# Altium footprint library VC_PCBLib.PcbLib: 63 footprints (part 1 of 4)
Each footprint in its own frame and in the unit in brackets; x right, y up, seen from the top. Pads: shape width x height; smd on the part's side, far side on the other; paste and mask are expansions set on the pad; w line width, h text height; cw(c..) or ccw(c..) is an arc to the next point about the centre after c.
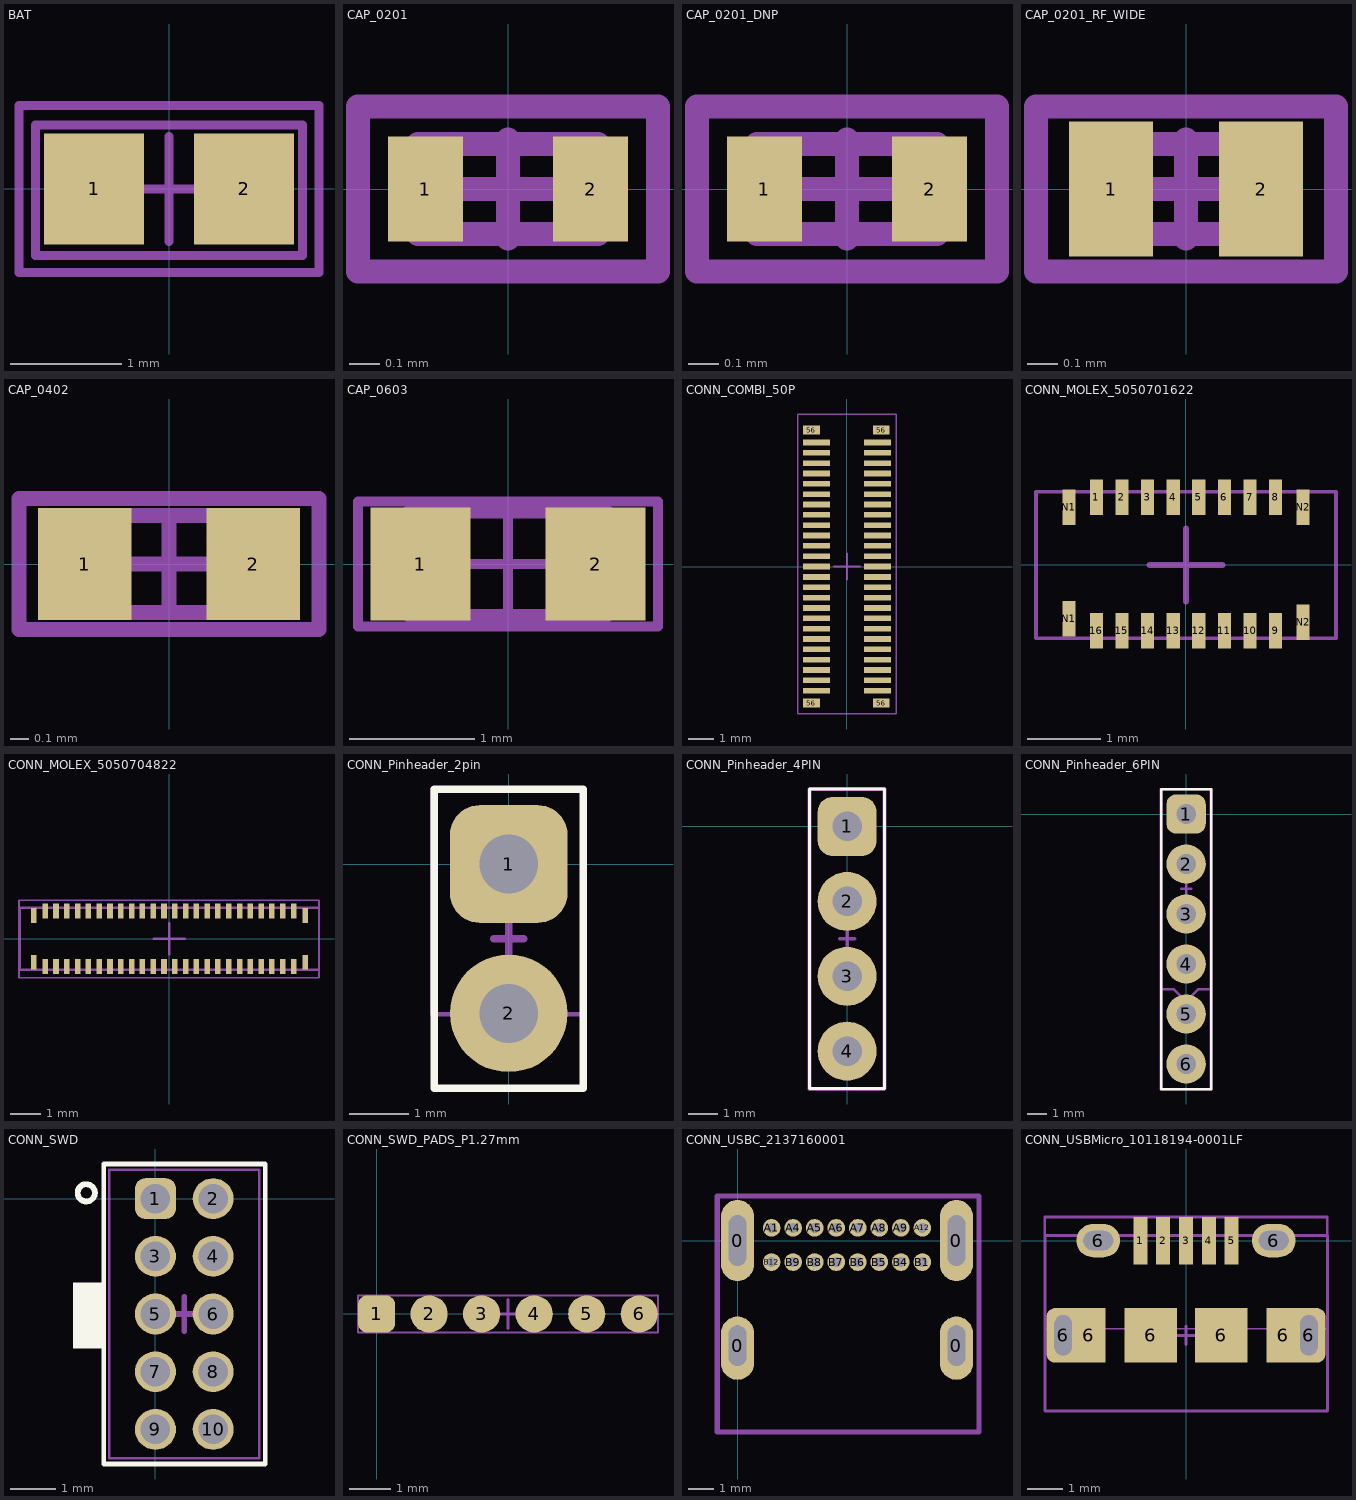
[diagram p0: the footprints below, top view; thin cyan lines are the x and y axes]

## BAT [mm] "Chip Capacitor, 2-Leads, Body 1.60x0.80mm, IPC Medium Density"
height 0.89
pads (2):
  rect 0.9x1 smd: 1(-0.675,0) 2(0.675,0)
Top Assembly:
  lines w0.08: -1.35,-0.75 1.35,-0.75 1.35,0.75 -1.35,0.75 -1.35,-0.75
Top Courtyard:
  lines w0.08: -1.2,-0.6 -1.2,0.575 1.2,0.575 1.2,-0.6 -1.2,-0.6
Top Component Center:
  lines w0.08: -0.475,0 0.475,0 ; 0,-0.475 0,0.475

## CAP_0201 [mm]
height 0.33
pads (2):
  rect 0.25x0.35 smd: 1(-0.275,0) 2(0.275,0)
Top Assembly:
  lines w0.08: -0.5,-0.275 -0.5,0.275 0.5,0.275 0.5,-0.275 -0.5,-0.275
Top Component Outline:
  lines w0.08: -0.3,-0.15 -0.3,0.15 0.3,0.15 0.3,-0.15 -0.3,-0.15
Top Courtyard:
  lines w0.08: -0.5,-0.275 0.5,-0.275 0.5,0.275 -0.5,0.275 -0.5,-0.275
Top Component Center:
  lines w0.08: -0.165,0 0.165,0 ; -0.05,0 0.05,0 ; 0,-0.165 0,0.165 ; 0,-0.05 0,0.05
3D body "CAP 0201.STEP": height 0.3, standoff 0, extent -0.3,-0.15 0.3,0.15

## CAP_0201_DNP [mm]
height 0.33
pads (2):
  rect 0.25x0.35 smd: 1(-0.275,0) 2(0.275,0)
Top Assembly:
  lines w0.08: -0.5,-0.275 0.5,-0.275 0.5,0.275 -0.5,0.275 -0.5,-0.275
Top Component Outline:
  lines w0.08: -0.3,-0.15 0.3,-0.15 0.3,0.15 -0.3,0.15 -0.3,-0.15
Top Courtyard:
  lines w0.08: -0.5,-0.275 -0.5,0.275 0.5,0.275 0.5,-0.275 -0.5,-0.275
Top Component Center:
  lines w0.08: -0.165,0 0.165,0 ; -0.05,0 0.05,0 ; 0,-0.165 0,0.165 ; 0,-0.05 0,0.05
3D body "CAP 0201.STEP": height 0.3, standoff 0, extent -0.3,-0.15 0.3,0.15

## CAP_0201_RF_WIDE [mm]
height 0.33
pads (2):
  rect 0.28x0.45 smd: 1(-0.25,0) 2(0.25,0)
Top Assembly:
  lines w0.08: -0.5,-0.275 0.5,-0.275 0.5,0.275 -0.5,0.275 -0.5,-0.275
Top Component Outline:
  lines w0.08: -0.3,-0.15 0.3,-0.15 0.3,0.15 -0.3,0.15 -0.3,-0.15
Top Courtyard:
  lines w0.08: -0.5,-0.275 -0.5,0.275 0.5,0.275 0.5,-0.275 -0.5,-0.275
Top Component Center:
  lines w0.08: -0.165,0 0.165,0 ; -0.05,0 0.05,0 ; 0,-0.165 0,0.165 ; 0,-0.05 0,0.05
3D body "CAP 0201.STEP": height 0.3, standoff 0, extent -0.3,-0.15 0.3,0.15

## CAP_0402 [mm] "Chip Capacitor, 2-Leads, Body 1.02x0.51mm, IPC Medium Density"
height 0.52
pads (2):
  rect 0.5x0.6 smd: 1(-0.45,0) 2(0.45,0)
Top Assembly:
  lines w0.08: -0.8,-0.35 -0.8,0.35 0.8,0.35 0.8,-0.35 -0.8,-0.35
Top Component Outline:
  lines w0.08: -0.5,-0.26 0.5,-0.26 0.5,0.26 -0.5,0.26 -0.5,-0.26
Top Courtyard:
  lines w0.08: -0.8,-0.35 0.8,-0.35 0.8,0.35 -0.8,0.35 -0.8,-0.35
Top Component Center:
  lines w0.08: -0.26,0 0.26,0 ; 0,-0.26 0,0.26
3D body "0402 cap.STEP": height 0.52, standoff 0, extent -0.5,-0.262 0.5,0.262

## CAP_0603 [mm] "Chip Capacitor, 2-Leads, Body 1.60x0.80mm, IPC Medium Density"
height 0.89
pads (2):
  rect 0.8x0.9 smd: 1(-0.7,0) 2(0.7,0)
Top Assembly:
  lines w0.08: -1.2,-0.5 -1.2,0.5 1.2,0.5 1.2,-0.5 -1.2,-0.5
Top Component Outline:
  lines w0.1: -0.8,-0.41 -0.8,0.415 0.8,0.415 0.8,-0.41 -0.8,-0.41
Top Component Center:
  lines w0.08: -0.475,0 0.475,0 ; 0,-0.475 0,0.475
3D body "0603 cap.STEP": height 0.82, standoff 0, extent -0.8,-0.424 0.8,0.4

## CONN_COMBI_50P [mm] "50Pin 0.4mm pitch connector footprint that accepts (male) connectors intended for different stacking heights:  Hirose - DF40C-50DP-0.4V(51) for 1.5mm - 3mm stacking height , JAE - WP7B-P050VA1-R8000 - for 0.7mm stacking height"
pads (54):
  rect 1.035x0.22 smd: 1(1.175,4.8) 2(1.175,4.4) 3(1.175,4) 4(1.175,3.6) 5(1.175,3.2) 6(1.175,2.8) 7(1.175,2.4) 8(1.175,2) 9(1.175,1.6) 10(1.175,1.2) 11(1.175,0.8) 12(1.175,0.4) 13(1.175,0) 14(1.175,-0.4) 15(1.175,-0.8) 16(1.175,-1.2) 17(1.175,-1.6) 18(1.175,-2) 19(1.175,-2.4) 20(1.175,-2.8) 21(1.175,-3.2) 22(1.175,-3.6) 23(1.175,-4) 24(1.175,-4.4) 25(1.175,-4.8) 26(-1.175,-4.8) 27(-1.175,-4.4) 28(-1.175,-4) 29(-1.175,-3.6) 30(-1.175,-3.2) 31(-1.175,-2.8) 32(-1.175,-2.4) 33(-1.175,-2) 34(-1.175,-1.6) 35(-1.175,-1.2) 36(-1.175,-0.8) 37(-1.175,-0.4) 38(-1.175,0) 39(-1.175,0.4) 40(-1.175,0.8) 41(-1.175,1.2) 42(-1.175,1.6) 43(-1.175,2) 44(-1.175,2.4) 45(-1.175,2.8) 46(-1.175,3.2) 47(-1.175,3.6) 48(-1.175,4) 49(-1.175,4.4) 50(-1.175,4.8)
  rect 0.65x0.35 smd: 56(-1.375,-5.275) 56(-1.375,5.275) 56(1.325,-5.275) 56(1.325,5.275)
Top Assembly:
  lines w0.05: -1.9,-5.7 1.9,-5.7 1.9,5.9 -1.9,5.9 -1.9,-5.7
Top Courtyard:
  lines w0.05: -1.9,-5.7 -1.9,5.9 1.9,5.9 1.9,-5.7 -1.9,-5.7
Top Component Center:
  lines w0.08: -0.5,0 0.5,0 ; 0,-0.5 0,0.5
3D body "DF40C-50DP.stp": height 1.14, standoff 0, extent -1.492,-5.737 1.478,5.783

## CONN_MOLEX_5050701622 [mm]
pads (20):
  rect 0.18x0.485 smd: 1(-1.225,0.925) 2(-0.875,0.925) 3(-0.525,0.925) 4(-0.175,0.925) 5(0.175,0.925) 6(0.525,0.925) 7(0.875,0.925) 8(1.225,0.925) 9(1.225,-0.9) 10(0.875,-0.9) 11(0.525,-0.9) 12(0.175,-0.9) 13(-0.175,-0.9) 14(-0.525,-0.9) 15(-0.875,-0.9) 16(-1.225,-0.9) N1(-1.6,-0.735) N1(-1.6,0.785) N2(1.6,-0.785) N2(1.6,0.785)
Top Component Outline:
  lines w0.05: -2.05,-1 2.05,-1 2.05,1 -2.05,1 -2.05,-1
Top Courtyard:
  lines w0.05: -2.05,-1 2.05,-1 2.05,1 -2.05,1 -2.05,-1
Top Component Center:
  lines w0.08: -0.5,0 0.5,0 ; 0,-0.5 0,0.5
3D body "5050701622.stp": height 0.46, standoff -0.02, extent -2.055,-1 2.055,1

## CONN_MOLEX_5050704822 [mm]
pads (52):
  rect 0.18x0.485 smd: 1(-4.025,0.9) 2(-3.675,0.9) 3(-3.325,0.9) 4(-2.975,0.9) 5(-2.625,0.9) 6(-2.275,0.9) 7(-1.925,0.9) 8(-1.575,0.9) 9(-1.225,0.9) 10(-0.875,0.9) 11(-0.525,0.9) 12(-0.175,0.9) 13(0.175,0.9) 14(0.525,0.9) 15(0.875,0.9) 16(1.225,0.9) 17(1.575,0.9) 18(1.925,0.9) 19(2.275,0.9) 20(2.625,0.9) 21(2.975,0.9) 22(3.325,0.9) 23(3.675,0.9) 24(4.025,0.9) 25(4.025,-0.9) 26(3.675,-0.9) 27(3.325,-0.9) 28(2.975,-0.9) 29(2.625,-0.9) 30(2.275,-0.9) 31(1.925,-0.9) 32(1.575,-0.9) 33(1.225,-0.9) 34(0.875,-0.9) 35(0.525,-0.9) 36(0.175,-0.9) 37(-0.175,-0.9) 38(-0.525,-0.9) 39(-0.875,-0.9) 40(-1.225,-0.9) 41(-1.575,-0.9) 42(-1.925,-0.9) 43(-2.275,-0.9) 44(-2.625,-0.9) 45(-2.975,-0.9) 46(-3.325,-0.9) 47(-3.675,-0.9) 48(-4.025,-0.9) N1(-4.4,-0.76) N1(-4.4,0.76) N2(4.4,-0.76) N2(4.4,0.76)
Top Component Outline:
  lines w0.08: -4.85,-1 4.85,-1 4.85,1 -4.85,1 -4.85,-1
Top Courtyard:
  lines w0.05: -4.875,-1.263 4.85,-1.263 4.85,1.25 -4.875,1.25 -4.875,-1.263
Top Component Center:
  lines w0.08: -0.5,0 0.5,0 ; 0,-0.5 0,0.5
3D body "5050704822.stp": height 0.46, standoff -0.02, extent -4.855,-1 4.855,1

## CONN_Pinheader_2pin [mm]
pads (2):
  rrect50% 2x2 hole 1: 1(0,0)
  round 2 hole 1: 2(0,-2.54)
Top Overlay:
  lines w0.127: -1.27,-3.81 1.27,-3.81 1.27,1.27 -1.27,1.27 -1.27,-3.81
Top Assembly:
  lines w0.05: -1.275,-3.825 1.275,-3.825 1.275,1.275 -1.275,1.275 -1.275,-3.825
  lines w0.08: -1.3,-2.548 -1.3,1.275 1.253,1.275 1.253,-2.548
Top Component Outline:
  lines w0.08: -1.283,-2.553 -1.283,1.27 1.27,1.27 1.27,-2.553 -1.283,-2.553
Top Courtyard:
  lines w0.08: -1.283,-2.553 -1.283,1.27 1.27,1.27 1.27,-2.553 -1.283,-2.553
Top Component Center:
  lines w0.127: -0.254,-1.27 0,-1.27 ; 0,-1.016 0,-1.27 ; 0,-1.27 0.254,-1.27 0,-1.27 ; 0,-1.27 0,-1.524 0,-1.27
3D body "PinHeader_1x02_P2.54mm_Vertical.step": height 9.04, standoff -2.5, extent -1.27,-3.81 1.27,1.27

## CONN_Pinheader_4PIN [mm]
pads (4):
  rrect50% 2x2 hole 1: 1(0,0)
  round 2 hole 1: 2(0,-2.54) 3(0,-5.08) 4(0,-7.62)
Top Overlay:
  lines w0.1: -1.27,-8.89 1.27,-8.89 1.27,1.27 -1.27,1.27 -1.27,-8.89
Top Assembly:
  lines w0.127: -1.27,-8.89 1.27,-8.89 1.27,1.27 -1.27,1.27 -1.27,-8.89
Top Component Outline:
  lines w0.127: -1.281,-8.902 1.259,-8.902 1.259,1.258 -1.281,1.258 -1.281,-8.902
Top Courtyard:
  lines w0.127: -1.27,-8.89 1.27,-8.89 1.27,1.27 -1.27,1.27 -1.27,-8.89
Top Component Center:
  lines w0.127: -0.252,-3.805 0.002,-3.805 ; 0.002,-4.059 0.002,-3.805 ; 0.002,-3.551 0.002,-3.805 ; 0.256,-3.805 0.002,-3.805
3D body "PinHeader_1x04_P2.54mm_Vertical.step": height 8.94, standoff -2.6, extent -1.27,-8.89 1.27,1.27

## CONN_Pinheader_6PIN [mm]
pads (6):
  rrect50% 2x2 hole 1: 1(0,0)
  round 2 hole 1: 2(0,-2.54) 3(0,-5.08) 4(0,-7.62) 5(0,-10.16) 6(0,-12.7)
Top Overlay:
  lines w0.127: -1.27,-13.97 1.27,-13.97 1.27,1.27 -1.27,1.27 -1.27,-13.97
Top Assembly:
  lines w0.127: -1.27,-8.89 -1.27,1.27 1.27,1.27 1.27,-8.89 0.635,-8.89 0,-9.525 -0.635,-8.89 -1.27,-8.89
Top Component Outline:
  lines w0.127: -1.281,-13.97 -1.281,1.258 1.259,1.258 1.259,-13.97 -1.281,-13.97
Top Courtyard:
  lines w0.127: -1.27,-13.97 -1.27,1.27 1.27,1.27 1.27,-13.97 -1.27,-13.97
Top Component Center:
  lines w0.127: -0.252,-3.805 0.002,-3.805 ; 0.002,-4.059 0.002,-3.805 ; 0.002,-3.551 0.002,-3.805 ; 0.256,-3.805 0.002,-3.805
3D body "PinHeader_1x02_P2.54mm_Vertical.step": height 9.04, standoff -2.5, extent -1.27,-13.97 1.27,-8.89
3D body "PinHeader_1x04_P2.54mm_Vertical.step": height 8.94, standoff -2.6, extent -1.27,-8.89 1.27,1.27

## CONN_SWD [mm]
pads (10):
  rrect50% 0.9x0.9 hole 0.65: 1(0,0)
  round 0.9 hole 0.65: 2(1.27,0) 3(0,-1.27) 4(1.27,-1.27) 5(0,-2.54) 6(1.27,-2.54) 7(0,-3.81) 8(1.27,-3.81) 9(0,-5.08) 10(1.27,-5.08)
Top Overlay:
  circle w0.127: c-1.524,0.127 r0.19
  rectangle: -1.818,-3.302 -1.143,-1.852
  lines w0.1: -1.143,-5.842 2.413,-5.842 2.413,0.762 -1.143,0.762 -1.143,-5.842
Top Assembly:
  lines w0.05: -1.016,-5.715 2.286,-5.715 2.286,0.635 -1.016,0.635 -1.016,-5.715
Top Component Outline:
  lines w0.05: -1.016,-5.715 2.286,-5.715 2.286,0.635 -1.016,0.635 -1.016,-5.715
Top Courtyard:
  lines w0.05: -1.016,-5.715 2.286,-5.715 2.286,0.635 -1.016,0.635 -1.016,-5.715
Top Component Center:
  lines w0.127: 0.254,-2.54 0.635,-2.54 ; 0.635,-2.921 0.635,-2.54 ; 0.635,-2.159 0.635,-2.54 ; 1.016,-2.54 0.635,-2.54
3D body "PinHeader_2x05_P1.27mm_Vertical.step": height 4.25, standoff -2.05, extent -1.065,-5.715 2.335,0.635

## CONN_SWD_PADS_P1.27mm [mm]
pads (6):
  rrect50% 0.9x0.9 smd paste-2539.97: 1(0,0)
  round 0.9 smd paste-2539.97: 2(1.27,0) 3(2.54,0) 4(3.81,0) 5(5.08,0) 6(6.35,0)
Top Component Outline:
  lines w0.05: -0.45,-0.45 6.8,-0.45 6.8,0.45 -0.45,0.45 -0.45,-0.45
Top Courtyard:
  lines w0.05: -0.447,-0.452 6.804,-0.452 6.804,0.449 -0.447,0.449 -0.447,-0.452
Top Component Center:
  lines w0.08: 2.825,0 3.525,0 ; 3.175,-0.35 3.175,0.35

## CONN_USBC_2137160001 [mm] "USB 2.0 Type C connector"
pads (20):
  oval 1.3x2.5 hole 0.7 slot 1.6 at 90 deg copper offset 0,-0.1 mask+0: 0(0,-4.15) 0(8.64,-4.15)
  oval 1.3x3.2 hole 0.7 slot 2 at 90 deg mask+0: 0(0,0) 0(8.64,0)
  round 0.7 hole 0.4 mask+0: A1(1.345,0.5) A4(2.195,0.5) A5(3.045,0.5) A6(3.895,0.5) A7(4.745,0.5) A8(5.595,0.5) A9(6.445,0.5) A12(7.295,0.5) B1(7.295,-0.85) B4(6.445,-0.85) B5(5.595,-0.85) B6(4.745,-0.85) B7(3.895,-0.85) B8(3.045,-0.85) B9(2.195,-0.85) B12(1.345,-0.85)
Top Courtyard:
  lines w0.2: -0.8,-7.55 -0.8,1.75 9.525,1.75 9.525,-7.55 -0.8,-7.55
3D body "2137160001.stp": height 3.38, standoff -0.99, extent -0.495,-7.55 9.145,1.42

## CONN_USBMicro_10118194-0001LF [mm]
pads (13):
  rect 0.4x1.35 smd: 1(-1.3,0) 2(-0.65,0) 3(0,0) 4(0.65,0) 5(1.3,0)
  rrect50% 0.95x1.55 hole 0.5 slot 1.15 at 90 deg: 6(-3.5,-2.7) 6(3.5,-2.7)
  rect 0.95x1.55 smd: 6(-2.775,-2.7) 6(2.775,-2.7)
  oval 1.25x0.95 hole 0.55 slot 0.85 at 0 deg: 6(-2.5,0) 6(2.5,0)
  rect 1.5x1.55 smd: 6(-1,-2.7) 6(1,-2.7)
Top Assembly:
  lines w0.05: -4.038,-2.513 4.025,-2.513 4.025,0.15 -4.038,0.15 -4.038,-2.513
Top Component Outline:
  lines w0.08: -4.021,-4.858 -4.021,0.142 4.029,0.142 4.029,-4.858 -4.021,-4.858
Top Courtyard:
  lines w0.08: -4.025,-4.85 -4.025,0.675 4.025,0.675 4.025,-4.85 -4.025,-4.85
Top Component Center:
  lines w0.08: -0.26,-2.7 0.26,-2.7 ; 0,-2.96 0,-2.44
3D body "10118194c.stp": height 2.72, standoff -0.55, extent -4.025,-5.43 4.025,0.15